# Altium footprint library PcbLib1.PcbLib: 1009 footprints (part 5 of 64)
Each footprint in its own frame and in the unit in brackets; x right, y up, seen from the top. Pads: shape width x height; smd on the part's side, far side on the other; paste and mask are expansions set on the pad; w line width, h text height; cw(c..) or ccw(c..) is an arc to the next point about the centre after c.
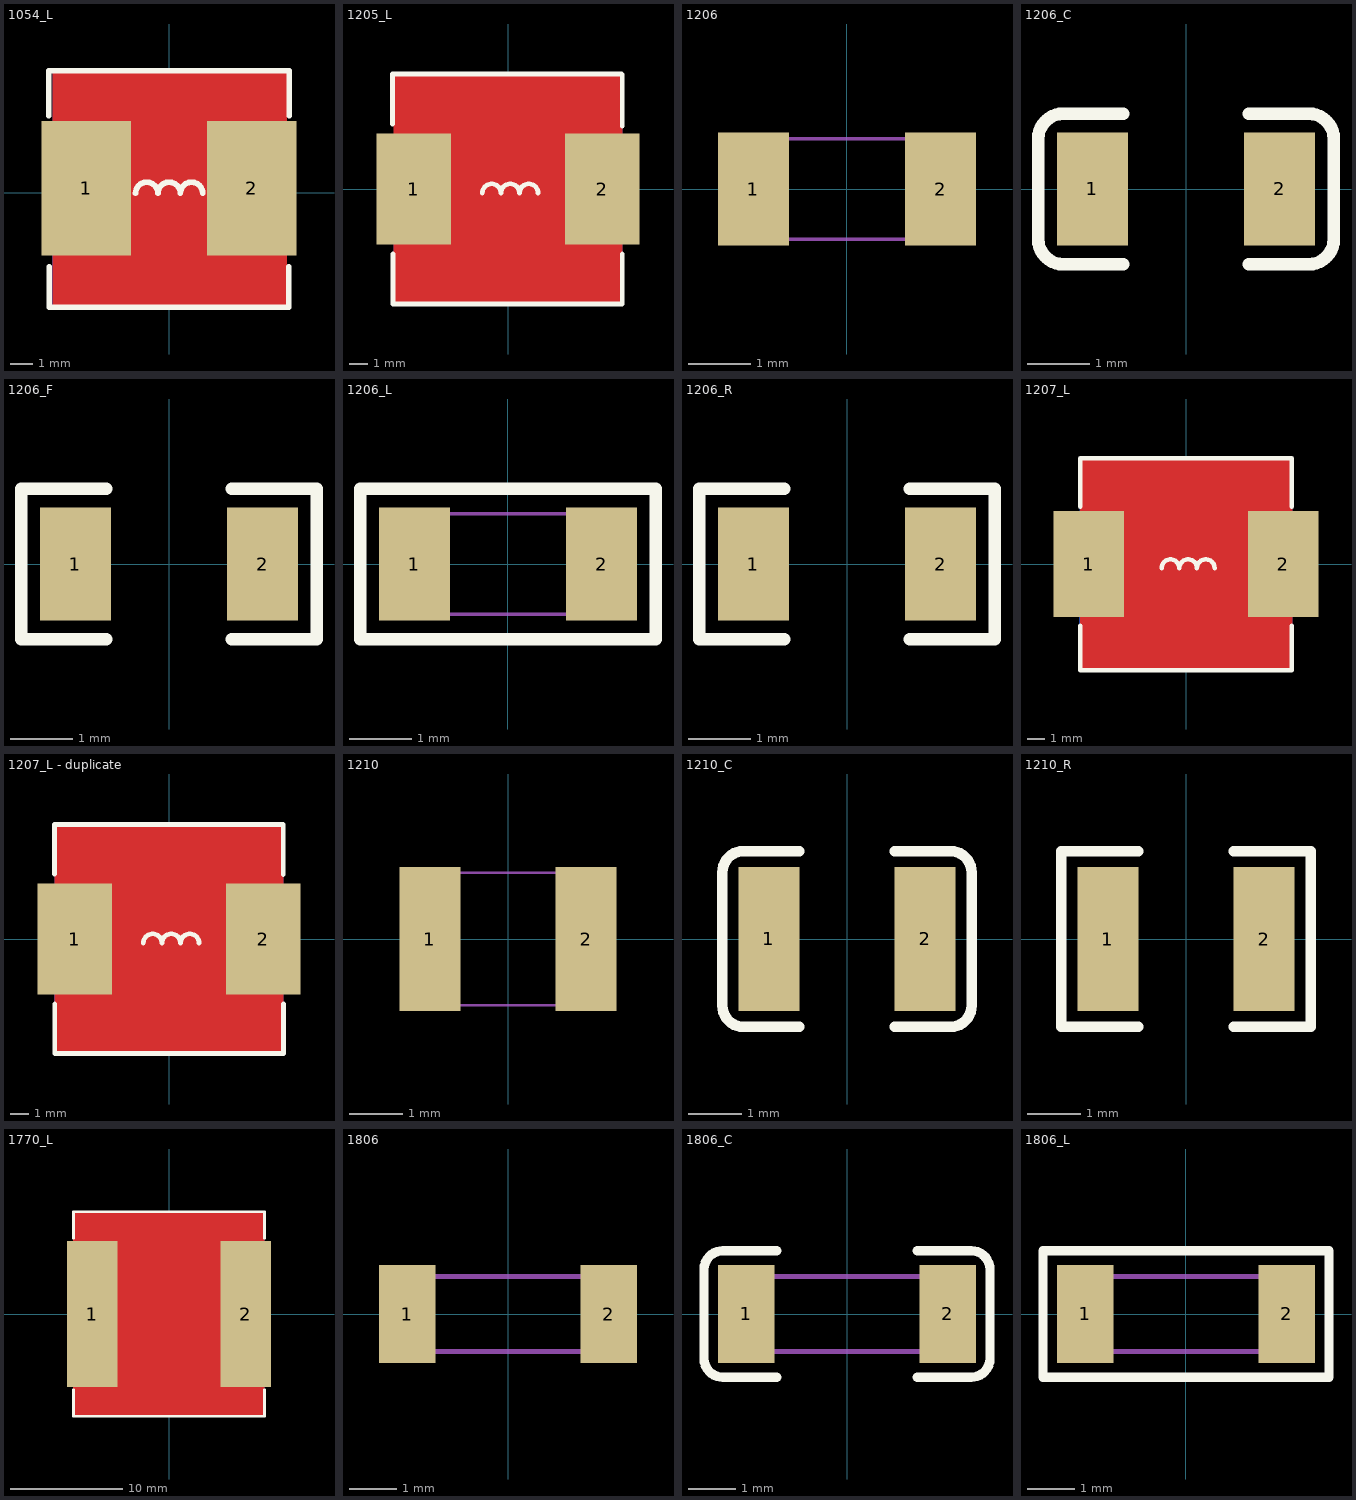
[diagram p4: the footprints below, top view; thin cyan lines are the x and y axes]

## 1054_L [mm]
height 7
pads (2):
  rect 4x6 smd: 1(-3.708,0.203) 2(3.683,0.203)
Top Layer:
  pour cut-out: -5.207,5.436 5.232,5.436 5.232,-5.029 -5.207,-5.029
Bottom Layer:
  pour cut-out: -5.196,5.334 5.232,5.334 5.232,-4.978 -5.218,-4.978
Top Overlay:
  lines w0.254: -5.385,3.453 -5.385,5.461 5.359,5.461 5.359,3.453 ; -5.359,-3.297 -5.359,-5.105 5.334,-5.105 5.334,-3.297 ; -1.507,-0.018 cw(c-1.007,-0.018) -0.507,-0.018 cw(c-0.007,-0.018) 0.493,-0.018 cw(c0.993,-0.018) 1.493,-0.018
3D body "IND_EPCOS_B82464-G4.stp": height 4.9, standoff 0, extent -5.175,-5.015 5.225,5.385

## 1205_L [mm]
height 7
pads (2):
  rect 4x6 smd: 1(-5.08,0) 2(5.08,0)
Top Layer:
  pour cut-out: -6.15,6.15 6.147,6.15 6.147,-6.15 -6.15,-6.15
Bottom Layer:
  pour cut-out: -6.122,6.15 6.147,6.15 6.147,-6.15 -6.148,-6.15
Top Overlay:
  lines w0.127: 6.121,6.198 6.147,6.172
  lines w0.254: -6.223,3.505 -6.223,6.198 5.842,6.198 6.121,6.198 ; -6.198,-3.5 -6.198,-6.198 6.147,-6.198 6.147,-3.5 ; -1.38,-0.221 cw(c-0.88,-0.221) -0.38,-0.221 cw(c0.12,-0.221) 0.62,-0.221 cw(c1.12,-0.221) 1.62,-0.221 ; 6.147,3.378 6.147,6.172
3D body "User Library-MSS1260.STEP": height 6.1, standoff -0.05, extent -6.15,-6.15 6.15,6.15

## 1206 [mm]
pads (2):
  rect 1.13x1.8 smd: 1(-1.49,0) 2(1.49,0)
Mechanical 13:
  lines w0.05: -1.6,-0.8 1.6,-0.8 1.6,0.8 -1.6,0.8 -1.6,-0.8

## 1206_C [mm]
pads (2):
  rect 1.13x1.8 smd: 1(-1.49,0) 2(1.49,0)
Top Overlay:
  lines w0.2: -1,-1.2 -1.955,-1.2 cw(c-1.955,-0.8) -2.355,-0.8 -2.355,0.8 cw(c-1.955,0.8) -1.955,1.2 -1,1.2 ; 1,-1.2 1.955,-1.2 ccw(c1.955,-0.8) 2.355,-0.8 2.355,0.8 ccw(c1.955,0.8) 1.955,1.2 1,1.2
3D body "C1206.STEP": height 1, standoff 0, extent -1.602,-0.813 1.598,0.787

## 1206_F [mm]
pads (2):
  rect 1.13x1.8 smd: 1(-1.49,0) 2(1.49,0)
Top Overlay:
  lines w0.2: -1,-1.2 -2.355,-1.2 -2.355,1.2 -1,1.2 ; 1,-1.2 2.355,-1.2 2.355,1.2 1,1.2
3D body "User Library-RES_3216-1206.STEP": height 0.85, standoff 0, extent -1.7,-0.864 1.65,0.866

## 1206_L [mm]
pads (2):
  rect 1.13x1.8 smd: 1(-1.49,0) 2(1.49,0)
Top Overlay:
  lines w0.2: -2.355,-1.2 -2.355,1.2 2.355,1.2 2.355,-1.2 -2.355,-1.2
Mechanical 13:
  lines w0.05: -1.6,-0.8 -1.6,0.8 1.6,0.8 1.6,-0.8 -1.6,-0.8

## 1206_R [mm]
pads (2):
  rect 1.13x1.8 smd: 1(-1.49,0) 2(1.49,0)
Top Overlay:
  lines w0.2: -1,-1.2 -2.355,-1.2 -2.355,1.2 -1,1.2 ; 1,-1.2 2.355,-1.2 2.355,1.2 1,1.2
3D body "R1206.STEP": height 0.6, standoff 0, extent -1.6,-0.8 1.6,0.8

## 1207_L [mm]
height 7
pads (2):
  rect 4x6 smd: 1(-5.5,0) 2(5.5,0)
Top Layer:
  pour cut-out: -5.994,5.944 6.02,5.944 6.02,-5.994 -5.994,-5.994
Bottom Layer:
  pour cut-out: -6.02,6.02 6.02,6.02 6.02,-5.994 -6.045,-5.994
Top Overlay:
  lines w0.254: -6,-3.5 -6,-6 6,-6 6,-3.5 ; -6,3.25 -6,6 6,6 6,3.25 ; -1.38,-0.221 cw(c-0.88,-0.221) -0.38,-0.221 cw(c0.12,-0.221) 0.62,-0.221 cw(c1.12,-0.221) 1.62,-0.221
3D body "User Library-MSS1260.STEP": height 6.1, standoff -0.05, extent -6.15,-6.15 6.15,6.15

## 1207_L - duplicate [mm]
height 7
pads (2):
  rect 4x6 smd: 1(-5.08,0) 2(5.08,0)
Top Layer:
  pour cut-out: -6.147,6.147 6.147,6.147 6.147,-6.147 -6.147,-6.147
Bottom Layer:
  pour cut-out: -6.146,6.147 6.147,6.147 6.147,-6.147 -6.172,-6.147
Top Overlay:
  lines w0.254: -6.172,3.505 -6.172,6.172 6.147,6.172 6.147,3.48 ; -6.147,-3.5 -6.147,-6.172 6.172,-6.172 6.172,-3.5 ; -1.38,-0.221 cw(c-0.88,-0.221) -0.38,-0.221 cw(c0.12,-0.221) 0.62,-0.221 cw(c1.12,-0.221) 1.62,-0.221
3D body "User Library-MSS1260.STEP": height 6.1, standoff -0.05, extent -6.15,-6.15 6.15,6.15

## 1210 [mm]
pads (2):
  rect 1.16x2.72 smd: 1(-1.475,0) 2(1.475,0)
Mechanical 13:
  lines w0.05: -1.6,-1.25 1.6,-1.25 1.6,1.25 -1.6,1.25 -1.6,-1.25

## 1210_C [mm]
pads (2):
  rect 1.16x2.72 smd: 1(-1.475,0) 2(1.475,0)
Top Overlay:
  lines w0.2: -0.9,-1.66 -1.955,-1.66 cw(c-1.955,-1.26) -2.355,-1.26 -2.355,1.26 cw(c-1.955,1.26) -1.955,1.66 -0.9,1.66 ; 0.9,-1.66 1.955,-1.66 ccw(c1.955,-1.26) 2.355,-1.26 2.355,1.26 ccw(c1.955,1.26) 1.955,1.66 0.9,1.66
3D body "User Library-cap_1210_lowprofile.step": height 1.3, standoff 0, extent -1.6,-1.25 1.6,1.25

## 1210_R [mm]
pads (2):
  rect 1.16x2.72 smd: 1(-1.475,0) 2(1.475,0)
Top Overlay:
  lines w0.2: -0.9,-1.66 -2.355,-1.66 -2.355,1.66 -0.9,1.66 ; 0.9,-1.66 2.355,-1.66 2.355,1.66 0.9,1.66
3D body "User Library-R_1210.STEP": height 0.6, standoff 0, extent -1.6,-1.25 1.6,1.25

## 1770_L [mm]
pads (2):
  rect 4.5x13 smd mask+0.051: 1(-6.85,0) 2(6.85,0)
Top Layer:
  pour cut-out: -8.509,9.093 -8.509,-9.093 8.484,-9.093 8.484,9.093
Bottom Layer:
  pour cut-out: -8.509,9.093 -8.509,-9.093 8.484,-9.093 8.484,9.093
Top Overlay:
  lines w0.254: -8.5,-6.74 -8.5,-9.1 8.5,-9.1 8.5,-6.74 ; -8.5,6.74 -8.5,9.1 8.5,9.1 8.5,6.74

## 1806 [mm]
pads (2):
  rect 1.2x2.1 smd: 1(-2.15,0) 2(2.15,0)
Mechanical 13:
  lines w0.1: -2.25,-0.8 2.25,-0.8 2.25,0.8 -2.25,0.8 -2.25,-0.8

## 1806_C [mm]
pads (2):
  rect 1.2x2.1 smd: 1(-2.15,0) 2(2.15,0)
Top Overlay:
  lines w0.2: -1.5,-1.35 -2.65,-1.35 cw(c-2.65,-0.95) -3.05,-0.95 -3.05,0.95 cw(c-2.65,0.95) -2.65,1.35 -1.5,1.35 ; 1.5,-1.35 2.65,-1.35 ccw(c2.65,-0.95) 3.05,-0.95 3.05,0.95 ccw(c2.65,0.95) 2.65,1.35 1.5,1.35
Mechanical 13:
  lines w0.1: -2.25,-0.8 -2.25,0.8 2.25,0.8 2.25,-0.8 -2.25,-0.8

## 1806_L [mm]
pads (2):
  rect 1.2x2.1 smd: 1(-2.15,0) 2(2.15,0)
Top Overlay:
  lines w0.2: -3.05,-1.35 3.05,-1.35 3.05,1.35 -3.05,1.35 -3.05,-1.35
Mechanical 13:
  lines w0.1: -2.25,-0.8 2.25,-0.8 2.25,0.8 -2.25,0.8 -2.25,-0.8